# Altium footprint library IMR_Lib.PcbLib: 58 footprints (part 4 of 4)
Each footprint in its own frame and in the unit in brackets; x right, y up, seen from the top. Pads: shape width x height; smd on the part's side, far side on the other; paste and mask are expansions set on the pad; w line width, h text height; cw(c..) or ccw(c..) is an arc to the next point about the centre after c.
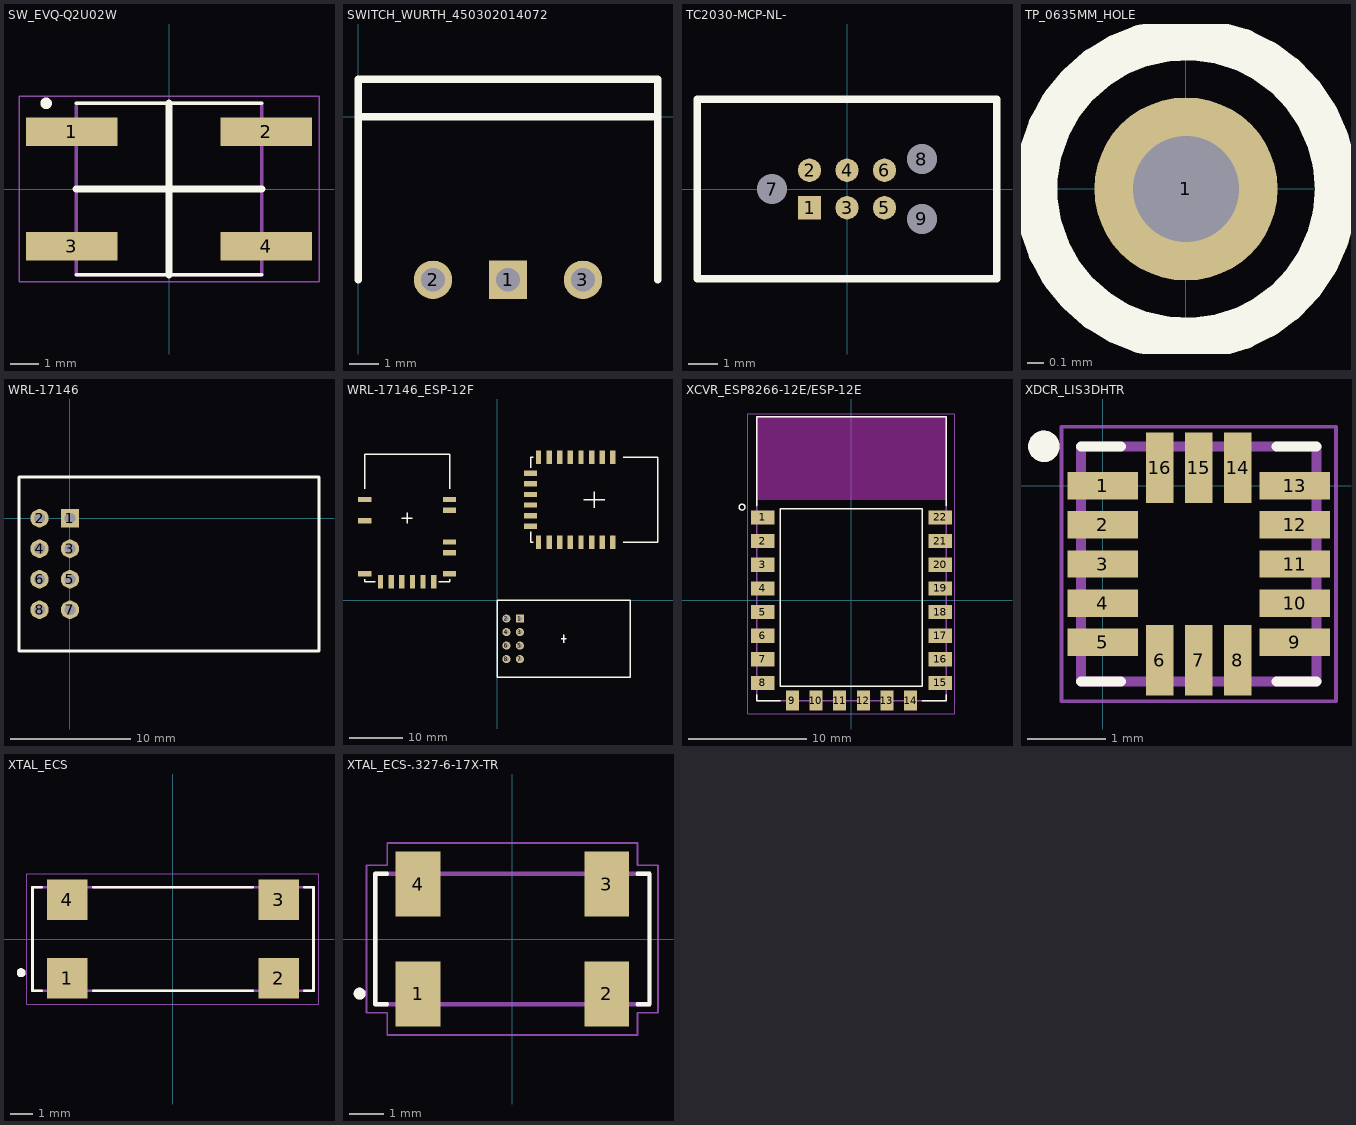
[diagram p3: the footprints below, top view; thin cyan lines are the x and y axes]

## SW_EVQ-Q2U02W [mm] "SWITCH"
height 2.25
pads (4):
  rect 3.2x1 smd: 1(-3.4,2) 2(3.4,2) 3(-3.4,-2) 4(3.4,-2)
Top Overlay:
  circle w0.2: c-4.3,3 r0.1
  lines w0.127: -3.25,-3 3.25,-3 ; -3.25,3 3.25,3
  lines w0.254: -3.25,0 3.25,0 ; 0,-3 0,3
Mechanical 13:
  lines w0.127: -3.25,-3 3.25,-3 3.25,3 -3.25,3 -3.25,-3
Mechanical 15:
  lines w0.05: -5.25,-3.25 5.25,-3.25 5.25,3.25 -5.25,3.25 -5.25,-3.25
3D body: height 1.8, standoff 0, extent -3.25,-3 3.25,3
3D body: height 2.3, standoff 1.8, extent -1.9,-1.897 1.9,1.897

## SWITCH_WURTH_450302014072 [mm] "SLIDE SWITCH"
height 2.5
pads (3):
  rect 1.3x1.3 hole 0.8: 1(5.08,-5.53)
  round 1.3 hole 0.8: 2(2.54,-5.53) 3(7.62,-5.53)
Top Overlay:
  lines w0.254: 0,-5.53 0,0 ; 10.16,-5.53 10.16,0 ; 0,0 0,1.27 10.16,1.27 10.16,0 ; 0,0 10.16,0
3D body: height 2.5, standoff 0, extent 0,0 6.35,1.27
3D body: height 3.91, standoff 0, extent 6.35,1.27 6.35,1.27
3D body: height 2.5, standoff 0, extent 0,-5.53 10.16,0

## TC2030-MCP-NL- [mm] "CABLE TAG-CONNECT IN-CIRCUIT"
pads (9):
  rect 0.787x0.787 smd: 1(-1.27,-0.635)
  round 0.787 smd: 2(-1.27,0.635) 3(0,-0.635) 4(0,0.635) 5(1.27,-0.635) 6(1.27,0.635)
  oval 1x0.991 hole 1 unplated: 7(-2.54,0)
  round 1 hole 1 unplated: 8(2.54,1.016) 9(2.54,-1.016)
Top Overlay:
  lines w0.254: -5.08,-3.048 -5.08,3.048 5.08,3.048 5.08,-3.048 -5.08,-3.048

## TP_0635MM_HOLE [mm] "TEST POINT 0.635mm"
pads (1):
  round 1.1 hole 0.635: 1(0,0)
Top Overlay:
  circle w0.254: c0,0 r0.9

## WRL-17146 [mil] "ESP8266 WIFI MODULE"
height 78.74
pads (8):
  rect 60x60 hole 35: 1(0,0)
  round 60 hole 35: 2(-100,0) 3(0,-100) 4(-100,-100) 5(0,-200) 6(-100,-200) 7(0,-300) 8(-100,-300)
Top Overlay:
  lines w10: -167.32,-435.43 816.93,-435.43 816.93,135.43 -167.32,135.43 -167.32,-435.43
3D body "WRL-17146.step": height 231.4, standoff -228.35, extent -165.35,-433.07 811.02,137.8

## WRL-17146_ESP-12F [mm] "ESP8266 AND ESP-12F COMBINE FOOTPRINT WIFI MODULE"
height 2
pads (44):
  rect 2.5x1 smd: 1(-9,5) 2(-9,19) 3(-9,9) 4(-25,15) 5(-9,11) 6(-25,19) 7(-9,17) 8(-25,5) 33(6.25,13.96) 33(6.25,15.96) 33(6.25,17.96) 33(6.25,19.96) 33(6.25,21.96) 33(6.25,23.96)
  rect 1.524x1.524 hole 0.889: 1(4.25,-3.44)
  rect 1x2.5 smd: 1(7.75,10.96) 2(21.75,10.96) 3(11.75,10.96) 4(17.75,26.96) 5(13.75,10.96) 6(21.75,26.96) 7(19.75,10.96) 8(7.75,26.96) 33(-22,3.5) 33(-20,3.5) 33(-18,3.5) 33(-16,3.5) 33(-14,3.5) 33(-12,3.5) 33(9.75,10.96) 33(9.75,26.96) 33(11.75,26.96) 33(13.75,26.96) 33(15.75,10.96) 33(15.75,26.96) 33(17.75,10.96) 33(19.75,26.96)
  round 1.524 hole 0.889: 2(1.71,-3.44) 3(4.25,-5.98) 4(1.71,-5.98) 5(4.25,-8.52) 6(1.71,-8.52) 7(4.25,-11.06) 8(1.71,-11.06)
Top Overlay:
  lines w0.254: -25,4 -25,3.5 -23,3.5 ; -25,21 -25,27.5 -9,27.5 -9,21 ; -18,15.5 -16,15.5 ; -17,14.5 -17,16.5 ; -11,3.5 -9,3.5 -9,4 ; 6.25,12.96 6.25,10.96 6.75,10.96 ; 6.25,24.96 6.25,26.96 6.75,26.96 ; 12,-7.25 13,-7.25 ; 12.5,-8 12.5,-6.5 ; 16.25,18.96 20.25,18.96 ; 18.25,17.46 18.25,20.46 ; 23.75,10.96 30.25,10.96 30.25,26.96 23.75,26.96 ; 0,-14.5 25,-14.5 25,0 0,0 0,-14.5
3D body "WRL-17146.step": height 5.88, standoff -5.8, extent 0.05,-14.44 24.85,0.06

## XCVR_ESP8266-12E/ESP-12E [mm]
pads (22):
  rect 2x1.2 smd: 1(-7.5,7) 2(-7.5,5) 3(-7.5,3) 4(-7.5,1) 5(-7.5,-1) 6(-7.5,-3) 7(-7.5,-5) 8(-7.5,-7) 15(7.5,-7) 16(7.5,-5) 17(7.5,-3) 18(7.5,-1) 19(7.5,1) 20(7.5,3) 21(7.5,5) 22(7.5,7)
  rect 1.1x1.7 smd: 9(-5,-8.5) 10(-3,-8.5) 11(-1,-8.5) 12(1,-8.5) 13(3,-8.5) 14(5,-8.5)
Top Overlay:
  circle w0.127: c-9.25,7.875 r0.25
  lines w0.127: -8,-8 -8,-8.5 -6,-8.5 ; -8,8 -8,15.5 8,15.5 8,8 ; 6,-8.5 8,-8.5 8,-8 ; -6,-7.26 6,-7.26 6,7.74 -6,7.74 -6,-7.26
Keep-Out Layer:
  region: 8,8.51 -8.009,8.51 -8.009,15.5 8,15.5
  region: 8,8.51 -8.009,8.51 -8.009,15.5 8,15.5
Mechanical 13:
  lines w0.127: -8,-8.5 8,-8.5 8,15.5 -8,15.5 -8,-8.5
Mechanical 15:
  lines w0.05: -8.75,-9.625 8.75,-9.625 8.75,15.75 -8.75,15.75 -8.75,-9.625
3D body "User Library-EPS8266 ESP-12E.step": height 2.65, standoff -0.04, extent -8.005,-8.505 8.005,15.5

## XDCR_LIS3DHTR [mm]
pads (16):
  rect 0.9x0.35 smd paste-1 mask+0: 1(0,0) 2(0,-0.5) 3(0,-1) 4(0,-1.5) 5(0,-2) 9(2.45,-2) 10(2.45,-1.5) 11(2.45,-1) 12(2.45,-0.5) 13(2.45,0)
  rect 0.35x0.9 smd paste-1 mask+0: 6(0.725,-2.225) 7(1.225,-2.225) 8(1.725,-2.225) 14(1.725,0.225) 15(1.225,0.225) 16(0.725,0.225)
Top Overlay:
  circle w0.2: c-0.75,0.5 r0.1
  lines w0.127: -0.275,-2.5 0.235,-2.5 ; -0.275,0.5 0.235,0.5 ; 2.215,-2.5 2.725,-2.5 ; 2.215,0.5 2.725,0.5
Top Paste:
  region: 0.18,-2.14 -0.18,-2.14 -0.18,-1.86 0.18,-1.86
  region: 0.18,-1.64 -0.18,-1.64 -0.18,-1.36 0.18,-1.36
  region: 0.905,-2.365 0.545,-2.365 0.545,-2.085 0.905,-2.085
  region: 0.18,-1.14 -0.18,-1.14 -0.18,-0.86 0.18,-0.86
  region: 0.18,-0.64 -0.18,-0.64 -0.18,-0.36 0.18,-0.36
  region: 0.18,-0.14 -0.18,-0.14 -0.18,0.14 0.18,0.14
  region: 0.905,0.085 0.545,0.085 0.545,0.365 0.905,0.365
  region: 1.405,-2.365 1.045,-2.365 1.045,-2.085 1.405,-2.085
  region: 1.905,-2.365 1.545,-2.365 1.545,-2.085 1.905,-2.085
  region: 2.63,-2.14 2.27,-2.14 2.27,-1.86 2.63,-1.86
  region: 2.63,-1.64 2.27,-1.64 2.27,-1.36 2.63,-1.36
  region: 1.905,0.085 1.545,0.085 1.545,0.365 1.905,0.365
  region: 1.405,0.085 1.045,0.085 1.045,0.365 1.405,0.365
  region: 2.63,-1.14 2.27,-1.14 2.27,-0.86 2.63,-0.86
  region: 2.63,-0.64 2.27,-0.64 2.27,-0.36 2.63,-0.36
  region: 2.63,-0.14 2.27,-0.14 2.27,0.14 2.63,0.14
Top Solder:
  region: 0.275,-2.225 -0.275,-2.225 -0.275,-1.775 0.275,-1.775
  region: 0.275,-1.725 -0.275,-1.725 -0.275,-1.275 0.275,-1.275
  region: 0.275,-1.225 -0.275,-1.225 -0.275,-0.775 0.275,-0.775
  region: 1,-2.45 0.45,-2.45 0.45,-2 1,-2
  region: 0.275,-0.725 -0.275,-0.725 -0.275,-0.275 0.275,-0.275
  region: 0.275,-0.225 -0.275,-0.225 -0.275,0.225 0.275,0.225
  region: 1,0 0.45,0 0.45,0.45 1,0.45
  region: 2,-2.45 1.45,-2.45 1.45,-2 2,-2
  region: 1.5,-2.45 0.95,-2.45 0.95,-2 1.5,-2
  region: 2.725,-2.225 2.175,-2.225 2.175,-1.775 2.725,-1.775
  region: 2.725,-1.725 2.175,-1.725 2.175,-1.275 2.725,-1.275
  region: 1.5,0 0.95,0 0.95,0.45 1.5,0.45
  region: 2,0 1.45,0 1.45,0.45 2,0.45
  region: 2.725,-1.225 2.175,-1.225 2.175,-0.775 2.725,-0.775
  region: 2.725,-0.725 2.175,-0.725 2.175,-0.275 2.725,-0.275
  region: 2.725,-0.225 2.175,-0.225 2.175,0.225 2.725,0.225
Mechanical 13:
  circle w0.2: c-0.75,0.5 r0.1
  lines w0.127: -0.275,-2.5 -0.275,0.5 2.725,0.5 2.725,-2.5 -0.275,-2.5
Mechanical 15:
  lines w0.05: -0.525,-2.75 -0.525,0.75 2.975,0.75 2.975,-2.75 -0.525,-2.75
3D body: height 1, standoff 0, extent -0.275,-2.5 2.725,0.5
3D body: height 1.01, standoff 1, extent 0.038,-0.098 0.436,0.302

## XTAL_ECS [mm] "CRYSTAL ECS SERIES"
height 0.094
pads (4):
  rect 1.8x1.8 smd: 1(-4.7,-1.75) 2(4.7,-1.75) 3(4.7,1.75) 4(-4.7,1.75)
Top Overlay:
  circle w0.2: c-6.75,-1.5 r0.1
  lines w0.127: -5.854,-2.3 -6.25,-2.3 -6.25,2.3 -5.854,2.3 ; -3.546,-2.3 3.546,-2.3 ; -3.546,2.3 3.546,2.3 ; 5.854,-2.3 6.25,-2.3 6.25,2.3 5.854,2.3
Mechanical 13:
  circle w0.2: c-6.75,-1.5 r0.1
  lines w0.127: -6.25,-2.3 6.25,-2.3 6.25,2.3 -6.25,2.3 -6.25,-2.3
Mechanical 15:
  lines w0.05: -6.5,-2.9 6.5,-2.9 6.5,2.9 -6.5,2.9 -6.5,-2.9
3D body "ECS-250-18-7SX-TR.STEP": height 3.7, standoff 0, extent -6.25,-2.3 6.25,2.3

## XTAL_ECS-.327-6-17X-TR [mm]
pads (4):
  rect 1.3x1.9 smd: 1(-2.75,-1.6) 2(2.75,-1.6) 3(2.75,1.6) 4(-2.75,1.6)
Top Overlay:
  circle w0.25: c-4.45,-1.596 r0.05
  lines w0.127: -4,-1.9 -4,1.9 ; -3.99,-1.9 -3.654,-1.9 ; -3.99,1.9 -3.654,1.9 ; 3.654,-1.9 3.98,-1.9 3.98,-1.89 ; 3.654,1.9 3.97,1.9 ; 4,-1.9 4,1.9
Mechanical 13:
  circle w0.25: c-4.45,-1.596 r0.05
  lines w0.127: -4,-1.9 4,-1.9 4,1.9 -4,1.9 -4,-1.9
Mechanical 15:
  lines w0.05: -4.25,-2.15 -3.65,-2.15 -3.65,-2.8 3.65,-2.8 3.65,-2.15 4.25,-2.15 4.25,2.15 3.65,2.15 3.65,2.8 -3.65,2.8 -3.65,2.15 -4.25,2.15 -4.25,-2.15
3D body "ECS-.327-6-17X-TR.STEP": height 2.5, standoff 0, extent -4.02,-1.9 4.02,1.9